# Altium footprint library Lib.PcbLib: 177 footprints (part 11 of 12)
Each footprint in its own frame and in the unit in brackets; x right, y up, seen from the top. Pads: shape width x height; smd on the part's side, far side on the other; paste and mask are expansions set on the pad; w line width, h text height; cw(c..) or ccw(c..) is an arc to the next point about the centre after c.
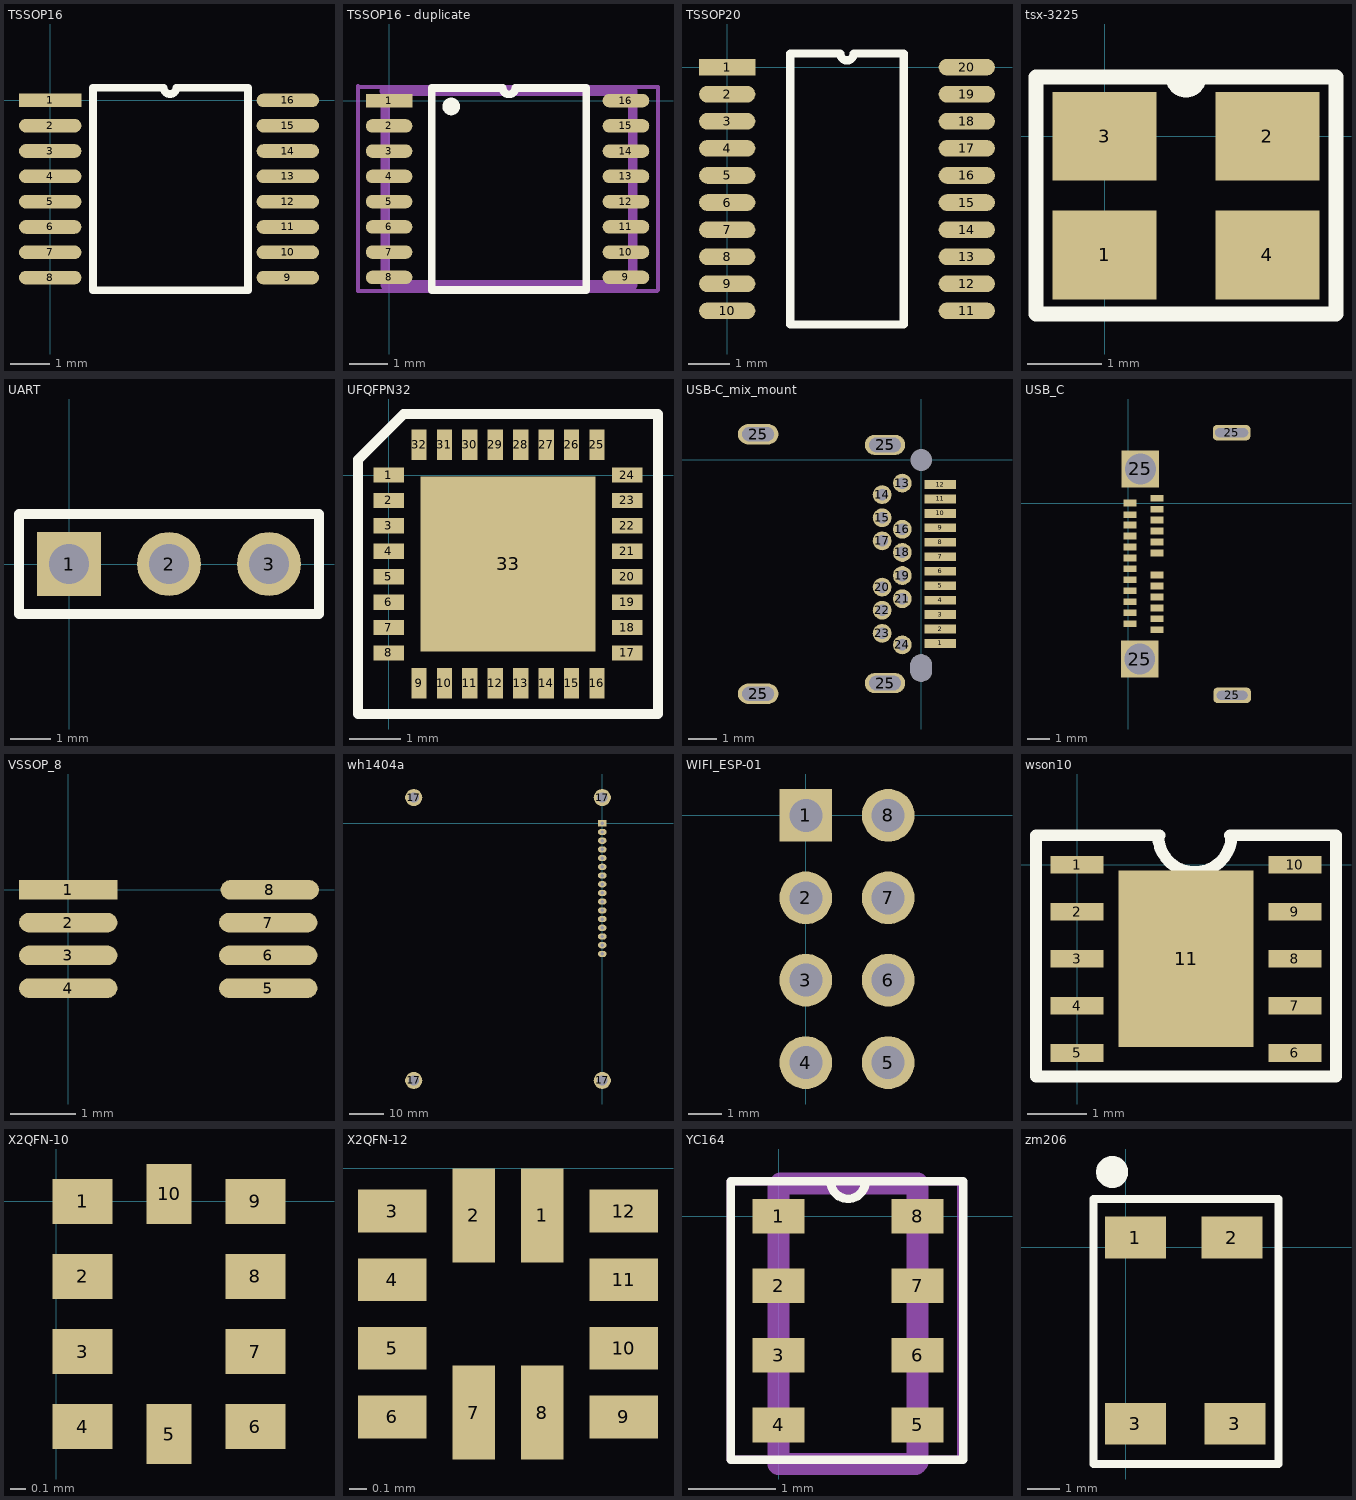
[diagram p10: the footprints below, top view; thin cyan lines are the x and y axes]

## TSSOP16 [mm]
pads (16):
  rect 1.6x0.35 smd: 1(0,0)
  oval 1.6x0.35 smd: 2(0,-0.65) 3(0,-1.3) 4(0,-1.95) 5(0,-2.6) 6(0,-3.25) 7(0,-3.9) 8(0,-4.55) 9(6.1,-4.55) 10(6.1,-3.9) 11(6.1,-3.25) 12(6.1,-2.6) 13(6.1,-1.95) 14(6.1,-1.3) 15(6.1,-0.65) 16(6.1,0)
Top Overlay:
  lines w0.2: 2.9,0.325 1.1,0.325 1.1,-4.875 5.075,-4.875 5.075,0.325 3.25,0.325 ; 2.913,0.325 ccw(c3.075,0.325) 3.237,0.325
3D body "User Library-TSSOP-16-1.step": height 1.1, standoff 0, extent -0.125,-4.75 6.275,0.25

## TSSOP16 - duplicate [mm]
pads (16):
  rect 1.2x0.35 smd: 1(0,0)
  oval 1.2x0.35 smd: 2(0,-0.65) 3(0,-1.3) 4(0,-1.95) 5(0,-2.6) 6(0,-3.25) 7(0,-3.9) 8(0,-4.55) 9(6.1,-4.55) 10(6.1,-3.9) 11(6.1,-3.25) 12(6.1,-2.6) 13(6.1,-1.95) 14(6.1,-1.3) 15(6.1,-0.65) 16(6.1,0)
Top Overlay:
  lines w0.2: 2.9,0.325 1.1,0.325 1.1,-4.875 5.075,-4.875 5.075,0.325 3.25,0.325 cw(c3.088,0.325) 2.925,0.325
  lines w0.254: 1.697,-0.126 ccw(c1.6,-0.15) 1.7,-0.15
Mechanical 11:
  lines w0.254: -0.125,0.25 6.275,0.25 6.275,-4.75 -0.1,-4.75 -0.1,0.225
Mechanical 13:
  lines w0.1: -0.125,-4.75 -0.125,0.25 6.275,0.25 6.275,-4.75 -0.125,-4.75
Mechanical 15:
  lines w0.1: -0.8,-4.9 6.9,-4.9 6.925,-4.875 6.925,0.35 -0.775,0.35 -0.8,0.375 -0.8,-4.9
3D body "User Library-TSSOP-16-1.step": height 1.1, standoff 0, extent -0.125,-4.75 6.275,0.25

## TSSOP20 [mm]
pads (20):
  rect 1.35x0.4 smd: 1(0,0)
  oval 1.35x0.4 smd: 2(0,-0.65) 3(0,-1.3) 4(0,-1.95) 5(0,-2.6) 6(0,-3.25) 7(0,-3.9) 8(0,-4.55) 9(0,-5.2) 10(0,-5.85) 11(5.75,-5.85) 12(5.75,-5.2) 13(5.75,-4.55) 14(5.75,-3.9) 15(5.75,-3.25) 16(5.75,-2.6) 17(5.75,-1.95) 18(5.75,-1.3) 19(5.75,-0.65) 20(5.75,0)
Top Overlay:
  lines w0.2: 1.51,-6.175 1.51,0.325 2.713,0.325 ccw(c2.875,0.325) 3.037,0.325 4.24,0.325 4.24,-6.175 1.51,-6.175
3D body "User Library-TSSOP-20-2.STEP": height 1.2, standoff 0, extent -0.325,-6.175 6.075,0.325

## tsx-3225 [mm]
pads (4):
  rect 1.4x1.2 smd paste+0: 1(0,-1.6)
  rect 1.4x1.2 smd: 2(2.2,0) 3(0,0) 4(2.2,-1.6)
Top Overlay:
  lines w0.2: 0.7,0.8 3.125,0.8 3.125,-2.4 -0.925,-2.4 -0.925,0.8 1.5,0.8 ; 0.923,0.8 ccw(c1.1,0.8) 1.277,0.8
3D body "User Library-tsx-3225-1.step": height 0.6, standoff 0, extent -0.5,-2.05 2.7,0.45

## UART [mm]
pads (3):
  rect 1.6x1.6 hole 1: 1(0,0)
  round 1.6 hole 1: 2(2.5,0) 3(5,0)
Top Overlay:
  lines w0.254: -1.25,-1.25 6.25,-1.25 6.25,1.25 5,1.25 -1.25,1.25 -1.25,-1.25

## UFQFPN32 [mm]
pads (33):
  rect 0.6x0.3 smd: 1(0,0) 2(0,-0.5) 3(0,-1) 4(0,-1.5) 5(0,-2) 6(0,-2.5) 7(0,-3) 8(0,-3.5) 17(4.7,-3.5) 18(4.7,-3) 19(4.7,-2.5) 20(4.7,-2) 21(4.7,-1.5) 22(4.7,-1) 23(4.7,-0.5) 24(4.7,0)
  rect 0.3x0.6 smd: 9(0.6,-4.1) 10(1.1,-4.1) 11(1.6,-4.1) 12(2.1,-4.1) 13(2.6,-4.1) 14(3.1,-4.1) 15(3.6,-4.1) 16(4.1,-4.1) 25(4.1,0.6) 26(3.6,0.6) 27(3.1,0.6) 28(2.6,0.6) 29(2.1,0.6) 30(1.6,0.6) 31(1.1,0.6) 32(0.6,0.6)
  rect 3.45x3.45 smd: 33(2.35,-1.75)
Top Overlay:
  lines w0.2: -0.6,-4.7 5.3,-4.7 5.3,1.2 0.3,1.2 -0.6,0.3 -0.6,-4.7
3D body "User Library-UFQFPN32.step": height 0.55, standoff 0, extent -0.15,-4.25 4.85,0.75

## USB-C_mix_mount [mm]
pads (30):
  rect 1.1x0.3 smd: 1(0.66,-6.35) 2(0.66,-5.85) 3(0.66,-5.35) 4(0.66,-4.85) 5(0.66,-4.35) 6(0.66,-3.85) 7(0.66,-3.35) 8(0.66,-2.85) 9(0.66,-2.35) 10(0.66,-1.85) 11(0.66,-1.35) 12(0.66,-0.85)
  round 0.65 hole 0.4: 13(-0.65,-0.8) 14(-1.35,-1.2) 15(-1.35,-2) 16(-0.65,-2.4) 17(-1.35,-2.8) 18(-0.65,-3.2) 19(-0.65,-4) 20(-1.35,-4.4) 21(-0.65,-4.8) 22(-1.35,-5.2) 23(-1.35,-6) 24(-0.65,-6.4)
  oval 1.4x0.7 hole 0.5 slot 1.1 at 0 deg: 25(-5.64,-8.09) 25(-5.64,0.89) 25(-1.25,-7.72) 25(-1.25,0.52)
  round 0 hole 0.75 slot 0.95 at 90 deg: 25(0,-7.2)
  round 0 hole 0.75: 25(0,0)
3D body "ausb1-dfn-ptr9.stp": height 3.15, standoff -1.3, extent -8.218,-8.48 1.668,1.25

## USB_C [mm]
pads (28):
  rect 0.6x0.3 smd: 1(0.075,0) 2(0.075,-0.525) 3(0.075,-1) 4(0.075,-1.5) 5(0.075,-2) 6(0.075,-2.5) 7(0.075,-3) 8(0.075,-3.5) 9(0.075,-4) 10(0.075,-4.5) 11(0.075,-5) 12(0.075,-5.5) 13(1.3,-5.775) 14(1.3,-5.275) 15(1.3,-4.775) 16(1.3,-4.275) 17(1.3,-3.775) 18(1.3,-3.275) 19(1.3,-2.275) 20(1.3,-1.775) 21(1.3,-1.275) 22(1.3,-0.775) 23(1.3,-0.275) 24(1.3,0.225)
  rect 1.7x1.7 hole 1.4 unplated: 25(0.525,-7.1)
  rect 1.7x1.7 hole 1.4: 25(0.55,1.55)
  rrect50% 1.7x0.7 hole 0.4 slot 1.5 at 0 deg: 25(4.7,3.2)
  rrect50% 1.7x0.7 hole 0.4 slot 1.4 at 0 deg: 25(4.725,-8.75)
3D body "84y3653_2295018-2.stp": height 2.45, standoff -1.15, extent -0.175,-8.845 7.92,3.295

## VSSOP_8 [mm]
pads (8):
  rect 1.5x0.3 smd: 1(0,0)
  oval 1.5x0.3 smd: 2(0,-0.5) 3(0,-1) 4(0,-1.5) 5(3.05,-1.5) 6(3.05,-1) 7(3.05,-0.5) 8(3.075,0)
3D body "User Library-SOP50P310X90-8N[8US8_VSSOP_DCU_MO-187CA].STEP": height 0.9, standoff 0, extent -0.075,-1.8 3.125,0.3

## wh1404a [mm]
pads (20):
  rect 2.5x1.8 hole 1: 1(0,0)
  oval 2.5x1.8 hole 1: 2(0,-2.54) 3(0,-5.08) 4(0,-7.62) 5(0,-10.16) 6(0,-12.7) 7(0,-15.24) 8(0,-17.78) 9(0,-20.32) 10(0,-22.86) 11(0,-25.4) 12(0,-27.94) 13(0,-30.48) 14(0,-33.02) 15(0,-35.56) 16(0,-38.1)
  round 5 hole 3: 17(-55,-75) 17(-55,7.5) 17(0,-75) 17(0,7.5)
3D body "User Library-FDCC1604A.STEP": height 21.3, standoff 8.9, extent -57.94,-76.84 2.06,10.16

## WIFI_ESP-01 [mm]
pads (8):
  rect 1.6x1.6 hole 1: 1(0,0)
  round 1.6 hole 1: 2(0,-2.5) 3(0,-5) 4(0,-7.5) 5(2.5,-7.5) 6(2.5,-5) 7(2.5,-2.5) 8(2.5,0)
3D body "User Library-Wi07C.STEP": height 6.38, standoff -5.3, extent -20.875,-11.05 3.925,3.45

## wson10 [mm]
pads (11):
  rect 0.9x0.3 smd: 1(0,0) 2(0,-0.8) 3(0,-1.6) 4(0,-2.4) 5(0,-3.2) 6(3.7,-3.2) 7(3.7,-2.4) 8(3.7,-1.6) 9(3.7,-0.8) 10(3.7,0)
  rect 2.3x3 smd: 11(1.85,-1.6)
Top Overlay:
  lines w0.2: 1.375,0.5 ccw(c2,0.5) 2.625,0.5 ; 1.4,0.5 0.625,0.5 -0.7,0.5 -0.7,-3.6 4.4,-3.6 4.4,0.5 3.375,0.5 2.6,0.5
3D body "User Library-WSON-10-1.step": height 0.8, standoff 0, extent -0.175,-3.6 3.825,0.4

## X2QFN-10 [mm]
pads (10):
  rect 0.4x0.3 smd: 1(0.175,0) 2(0.175,-0.5) 3(0.175,-1) 4(0.175,-1.5) 6(1.325,-1.5) 7(1.325,-1) 8(1.325,-0.5) 9(1.325,0)
  rect 0.3x0.4 smd: 5(0.75,-1.55) 10(0.75,0.05)
3D body "User Library-QFN-10 2x1_5mm.STEP": height 0.6, standoff 0, extent 0,-1.75 1.5,0.25

## X2QFN-12 [mm]
pads (12):
  rect 0.25x0.55 smd: 1(1.325,-0.275) 2(0.925,-0.275) 7(0.925,-1.425) 8(1.325,-1.425)
  rect 0.4x0.25 smd: 3(0.45,-0.25) 4(0.45,-0.65) 5(0.45,-1.05) 6(0.45,-1.45) 9(1.8,-1.45) 10(1.8,-1.05) 11(1.8,-0.65) 12(1.8,-0.25)
3D body "User Library-X2QFN-12_1_65.STEP": height 0.6, standoff 0, extent 0.3,-1.675 1.95,-0.025

## YC164 [mm]
pads (8):
  rect 0.6x0.4 smd: 1(0,0) 2(0,-0.8) 3(0,-1.6) 4(0,-2.4) 5(1.6,-2.4) 6(1.6,-1.6) 7(1.6,-0.8) 8(1.6,0)
Top Overlay:
  lines w0.1: -0.55,-2.8 2.125,-2.8 2.125,0.4 0.6,0.4 ccw(c0.8,0.4) 1,0.4 -0.55,0.4 -0.55,-2.8
Mechanical 11:
  lines w0.254: 0,-2.85 1.575,-2.85 1.6,-2.825 1.6,0.375 0.025,0.375 0,0.35 0,-2.85
Mechanical 13:
  lines w0.1: 0,-2.825 1.6,-2.825 1.6,0.375 0,0.375 0,-2.825
Mechanical 15:
  lines w0.1: -0.55,-2.8 -0.55,0.4 2.1,0.4 2.1,-2.8 -0.55,-2.8
3D body "User Library-Array-1206-4Way-Var1.STEP": height 0.5, standoff 0, extent 0,-2.825 1.6,0.375

## zm206 [mm]
pads (4):
  rect 1.9x1.3 smd: 1(0.3,0.3) 2(3.3,0.3) 3(0.3,-5.5) 3(3.4,-5.5)
Top Overlay:
  circle w0.5: c-0.426,2.34 r0.25
  lines w0.254: -1,-6.75 4.75,-6.75 4.75,1.5 -1,1.5 -1,-6.75
3D body "User Library-ZM206.step": height 2.53, standoff 0, extent -0.048,-6.596 3.752,1.404